# Altium schematic symbol library Capacitor - Aluminium TH.SchLib: 4591 symbols (part 6 of 27)
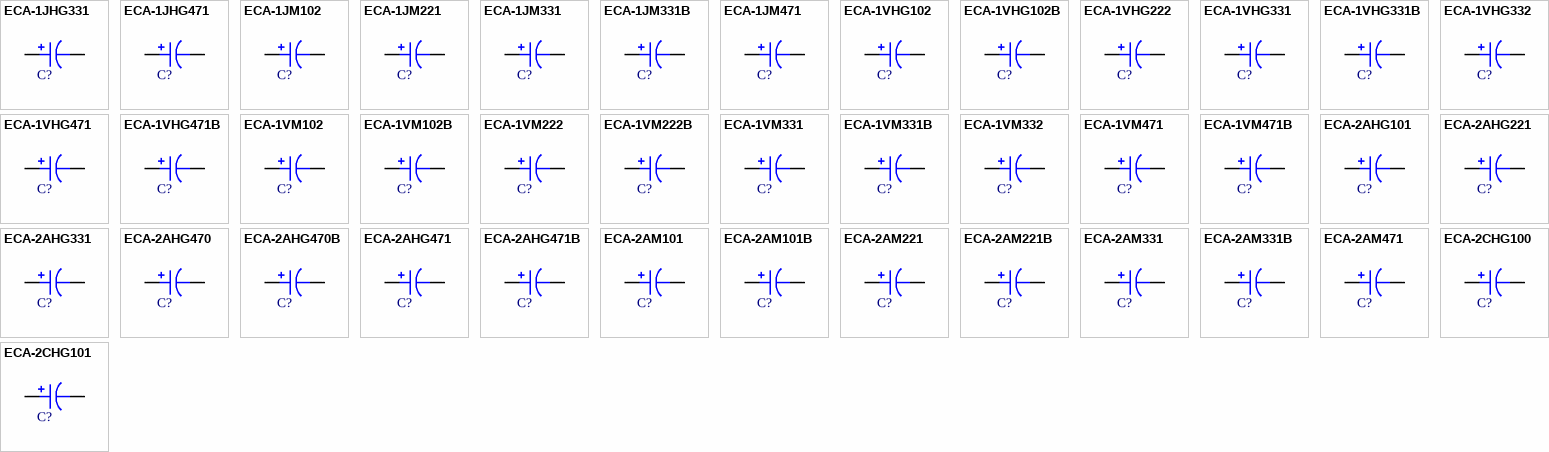
[diagram p119: symbols ECA-1JHG331 to ECA-2CHG101]

## ECA-2CHG100
designator C?, comment 10uF  (value not drawn)
CAP ALUM 10UF 20% 160V RADIAL; Part Number: ECA-2CHG100; Manufacturer: Panasonic Electronic Components; TemperatureRange: -25C ~ 105C; Type: Polar; Ripple Current: 70mA @ 120Hz; Value: 10uF; PartId: 24869; Supplier 1: Digi-Key; Supplier Part Number 1: P5856-ND; ComponentLink1Description: Datasheet; ComponentLink1URL: http://industrial.panasonic.com/www-cgi/jvcr13pz.cgi?E+PZ+3+ABA0026+ECA2CHG100+7+WW; ComponentLink2Description: Digi-Key Listing; ComponentLink2URL: https://www.digikey.com/product-detail/en/panasonic-electronic-components/ECA-2CHG100/P5856-ND/245205; Tolerance: 20%; Voltage: 160V; Price: 0.48; Device Package: Radial, Can, 10mm
footprint CAP AL TH D10 L5 H14.5
pins: 1, 2

## ECA-2CHG101
designator C?, comment 100uF  (value not drawn)
CAP ALUM 100UF 20% 160V RADIAL; Part Number: ECA-2CHG101; Manufacturer: Panasonic Electronic Components; TemperatureRange: -25C ~ 105C; Type: Polar; Ripple Current: 70mA @ 120Hz; Value: 100uF; PartId: 26828; Supplier 1: Digi-Key; Supplier Part Number 1: P5860-ND; ComponentLink1Description: Datasheet; ComponentLink1URL: http://industrial.panasonic.com/www-cgi/jvcr13pz.cgi?E+PZ+3+ABA0026+ECA2CHG101+7+WW; ComponentLink2Description: Digi-Key Listing; ComponentLink2URL: https://www.digikey.com/product-detail/en/panasonic-electronic-components/ECA-2CHG101/P5860-ND/245209; Tolerance: 20%; Voltage: 160V; Price: 0.98; Device Package: Radial, Can, 16mm
footprint CAP AL TH D16 L7.5 H27
pins: 1, 2

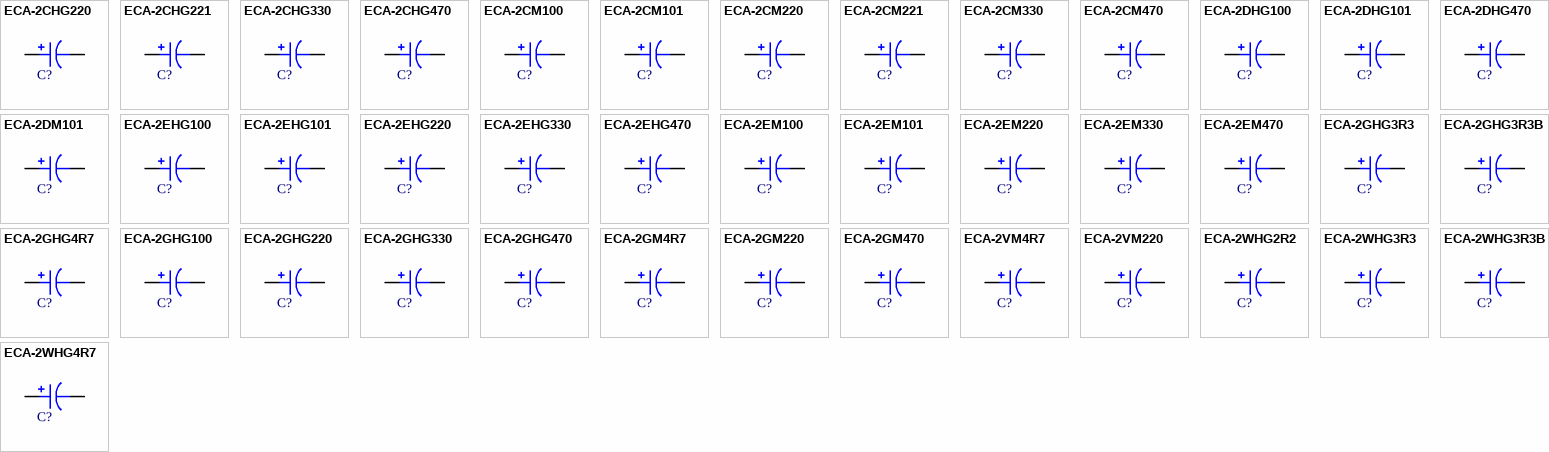
[diagram p22: symbols ECA-2CHG220 to ECA-2WHG4R7]

## ECA-2CHG220
designator C?, comment 22uF  (value not drawn)
CAP ALUM 22UF 20% 160V RADIAL; Part Number: ECA-2CHG220; Manufacturer: Panasonic Electronic Components; TemperatureRange: -25C ~ 105C; Type: Polar; Ripple Current: 130mA @ 120Hz; Value: 22uF; PartId: 25888; Supplier 1: Digi-Key; Supplier Part Number 1: P5857-ND; ComponentLink1Description: Datasheet; ComponentLink1URL: http://industrial.panasonic.com/www-cgi/jvcr13pz.cgi?E+PZ+3+ABA0026+ECA2CHG220+7+WW; ComponentLink2Description: Digi-Key Listing; ComponentLink2URL: https://www.digikey.com/product-detail/en/panasonic-electronic-components/ECA-2CHG220/P5857-ND/245206; Tolerance: 20%; Voltage: 160V; Price: 0.65; Device Package: Radial, Can, 10mm
footprint CAP AL TH D10 L5 H22
pins: 1, 2

## ECA-2CHG221
designator C?, comment 220uF  (value not drawn)
CAP ALUM 220UF 20% 160V RADIAL; Part Number: ECA-2CHG221; Manufacturer: Panasonic Electronic Components; TemperatureRange: -25C ~ 105C; Type: Polar; Ripple Current: 540mA @ 120Hz; Value: 220uF; PartId: 27038; Supplier 1: Digi-Key; Supplier Part Number 1: P5861-ND; ComponentLink1Description: Datasheet; ComponentLink1URL: http://industrial.panasonic.com/www-cgi/jvcr13pz.cgi?E+PZ+3+ABA0026+ECA2CHG221+7+WW; ComponentLink2Description: Digi-Key Listing; ComponentLink2URL: https://www.digikey.com/product-detail/en/panasonic-electronic-components/ECA-2CHG221/P5861-ND/245210; Tolerance: 20%; Voltage: 160V; Price: 1.53; Device Package: Radial, Can, 16mm
footprint CAP AL TH D16 L7.5 H33.5
pins: 1, 2

## ECA-2CHG330
designator C?, comment 33uF  (value not drawn)
CAP ALUM 33UF 20% 160V RADIAL; Part Number: ECA-2CHG330; Manufacturer: Panasonic Electronic Components; TemperatureRange: -25C ~ 105C; Type: Polar; Ripple Current: 180mA @ 120Hz; Value: 33uF; PartId: 25887; Supplier 1: Digi-Key; Supplier Part Number 1: P5858-ND; ComponentLink1Description: Datasheet; ComponentLink1URL: http://industrial.panasonic.com/www-cgi/jvcr13pz.cgi?E+PZ+3+ABA0026+ECA2CHG330+7+WW; ComponentLink2Description: Digi-Key Listing; ComponentLink2URL: https://www.digikey.com/product-detail/en/panasonic-electronic-components/ECA-2CHG330/P5858-ND/245207; Tolerance: 20%; Voltage: 160V; Price: 0.65; Device Package: Radial, Can, 10mm
footprint CAP AL TH D10 L5 H22
pins: 1, 2

## ECA-2CHG470
designator C?, comment 47uF  (value not drawn)
CAP ALUM 47UF 20% 160V RADIAL; Part Number: ECA-2CHG470; Manufacturer: Panasonic Electronic Components; TemperatureRange: -25C ~ 105C; Type: Polar; Ripple Current: 220mA @ 120Hz; Value: 47uF; PartId: 23267; Supplier 1: Digi-Key; Supplier Part Number 1: P5859-ND; ComponentLink1Description: Datasheet; ComponentLink1URL: http://industrial.panasonic.com/www-cgi/jvcr13pz.cgi?E+PZ+3+ABA0026+ECA2CHG470+7+WW; ComponentLink2Description: Digi-Key Listing; ComponentLink2URL: https://www.digikey.com/product-detail/en/panasonic-electronic-components/ECA-2CHG470/P5859-ND/245208; Tolerance: 20%; Voltage: 160V; Price: 0.75; Device Package: Radial, Can, 12.5mm
footprint CAP AL TH D12.5 L5 H22
pins: 1, 2

## ECA-2CM100
designator C?, comment 10uF  (value not drawn)
CAP ALUM 10UF 20% 160V RADIAL; Part Number: ECA-2CM100; Manufacturer: Panasonic Electronic Components; TemperatureRange: -25C ~ 85C; Type: Polar; Ripple Current: 105mA @ 120Hz; Value: 10uF; PartId: 24851; Supplier 1: Digi-Key; Supplier Part Number 1: P5322-ND; ComponentLink1Description: Datasheet; ComponentLink1URL: http://industrial.panasonic.com/www-cgi/jvcr13pz.cgi?E+PZ+3+ABA0012+ECA2CM100+7+WW; ComponentLink2Description: Digi-Key Listing; ComponentLink2URL: https://www.digikey.com/product-detail/en/panasonic-electronic-components/ECA-2CM100/P5322-ND/245076; Tolerance: 20%; Voltage: 160V; Price: 0.47; Device Package: Radial, Can, 10mm
footprint CAP AL TH D10 L5 H14.5
pins: 1, 2

## ECA-2CM101
designator C?, comment 100uF  (value not drawn)
CAP ALUM 100UF 20% 160V RADIAL; Part Number: ECA-2CM101; Manufacturer: Panasonic Electronic Components; TemperatureRange: -25C ~ 85C; Type: Polar; Ripple Current: 515mA @ 120Hz; Value: 100uF; PartId: 23891; Supplier 1: Digi-Key; Supplier Part Number 1: P5326-ND; ComponentLink1Description: Datasheet; ComponentLink1URL: http://industrial.panasonic.com/www-cgi/jvcr13pz.cgi?E+PZ+3+ABA0012+ECA2CM101+7+WW; ComponentLink2Description: Digi-Key Listing; ComponentLink2URL: https://www.digikey.com/product-detail/en/panasonic-electronic-components/ECA-2CM101/P5326-ND/245080; Tolerance: 20%; Voltage: 160V; Price: 0.86; Device Package: Radial, Can, 12.5mm
footprint CAP AL TH D12.5 L5 H27
pins: 1, 2

## ECA-2CM220
designator C?, comment 22uF  (value not drawn)
CAP ALUM 22UF 20% 160V RADIAL; Part Number: ECA-2CM220; Manufacturer: Panasonic Electronic Components; TemperatureRange: -25C ~ 85C; Type: Polar; Ripple Current: 175mA @ 120Hz; Value: 22uF; PartId: 25176; Supplier 1: Digi-Key; Supplier Part Number 1: P5323-ND; ComponentLink1Description: Datasheet; ComponentLink1URL: http://industrial.panasonic.com/www-cgi/jvcr13pz.cgi?E+PZ+3+ABA0012+ECA2CM220+7+WW; ComponentLink2Description: Digi-Key Listing; ComponentLink2URL: https://www.digikey.com/product-detail/en/panasonic-electronic-components/ECA-2CM220/P5323-ND/245077; Tolerance: 20%; Voltage: 160V; Price: 0.46; Device Package: Radial, Can, 10mm
footprint CAP AL TH D10 L5 H17.5
pins: 1, 2

## ECA-2CM221
designator C?, comment 220uF  (value not drawn)
CAP ALUM 220UF 20% 160V RADIAL; Part Number: ECA-2CM221; Manufacturer: Panasonic Electronic Components; TemperatureRange: -25C ~ 85C; Type: Polar; Ripple Current: 830mA @ 120Hz; Value: 220uF; PartId: 27004; Supplier 1: Digi-Key; Supplier Part Number 1: P5327-ND; ComponentLink1Description: Datasheet; ComponentLink1URL: http://industrial.panasonic.com/www-cgi/jvcr13pz.cgi?E+PZ+3+ABA0012+ECA2CM221+7+WW; ComponentLink2Description: Digi-Key Listing; ComponentLink2URL: https://www.digikey.com/product-detail/en/panasonic-electronic-components/ECA-2CM221/P5327-ND/245081; Tolerance: 20%; Voltage: 160V; Price: 1.37; Device Package: Radial, Can, 16mm
footprint CAP AL TH D16 L7.5 H33.5
pins: 1, 2

## ECA-2CM330
designator C?, comment 33uF  (value not drawn)
CAP ALUM 33UF 20% 160V RADIAL; Part Number: ECA-2CM330; Manufacturer: Panasonic Electronic Components; TemperatureRange: -25C ~ 85C; Type: Polar; Ripple Current: 235mA @ 120Hz; Value: 33uF; PartId: 25849; Supplier 1: Digi-Key; Supplier Part Number 1: P5324-ND; ComponentLink1Description: Datasheet; ComponentLink1URL: http://industrial.panasonic.com/www-cgi/jvcr13pz.cgi?E+PZ+3+ABA0012+ECA2CM330+7+WW; ComponentLink2Description: Digi-Key Listing; ComponentLink2URL: https://www.digikey.com/product-detail/en/panasonic-electronic-components/ECA-2CM330/P5324-ND/245078; Tolerance: 20%; Voltage: 160V; Price: 0.54; Device Package: Radial, Can, 10mm
footprint CAP AL TH D10 L5 H22
pins: 1, 2

## ECA-2CM470
designator C?, comment 47uF  (value not drawn)
CAP ALUM 47UF 20% 160V RADIAL; Part Number: ECA-2CM470; Manufacturer: Panasonic Electronic Components; TemperatureRange: -25C ~ 85C; Type: Polar; Ripple Current: 320mA @ 120Hz; Value: 47uF; PartId: 23265; Supplier 1: Digi-Key; Supplier Part Number 1: P5325-ND; ComponentLink1Description: Datasheet; ComponentLink1URL: http://industrial.panasonic.com/www-cgi/jvcr13pz.cgi?E+PZ+3+ABA0012+ECA2CM470+7+WW; ComponentLink2Description: Digi-Key Listing; ComponentLink2URL: https://www.digikey.com/product-detail/en/panasonic-electronic-components/ECA-2CM470/P5325-ND/245079; Tolerance: 20%; Voltage: 160V; Price: 0.75; Device Package: Radial, Can, 12.5mm
footprint CAP AL TH D12.5 L5 H22
pins: 1, 2

## ECA-2DHG100
designator C?, comment 10uF  (value not drawn)
CAP 10UF 200V ELECT NHG RADIAL; Part Number: ECA-2DHG100; Manufacturer: Panasonic Electronic Components; TemperatureRange: -25C ~ 105C; Tolerance: 20%; Type: Polar; Ripple Current: 80mA @ 120Hz; Value: 10uF; PartId: 25300; Supplier 1: Digi-Key; Supplier Part Number 1: P19449-ND; ComponentLink1Description: Datasheet; ComponentLink1URL: http://industrial.panasonic.com/www-cgi/jvcr13pz.cgi?E+PZ+3+ABA0026+ECA2DHG100+7+WW; ComponentLink2Description: Digi-Key Listing; ComponentLink2URL: https://www.digikey.com/product-detail/en/panasonic-electronic-components/ECA-2DHG100/P19449-ND/334745; Voltage: 200V; Price: 0.63; Device Package: Radial, Can, 10mm
footprint CAP AL TH D10 L5 H17.5
pins: 1, 2

## ECA-2DHG101
designator C?, comment 100uF  (value not drawn)
CAP ALUM 100UF 20% 200V RADIAL; Part Number: ECA-2DHG101; Manufacturer: Panasonic Electronic Components; TemperatureRange: -25C ~ 105C; Type: Polar; Ripple Current: 335mA @ 120Hz; Value: 100uF; PartId: 26852; Supplier 1: Digi-Key; Supplier Part Number 1: P19450-ND; ComponentLink1Description: Datasheet; ComponentLink1URL: http://industrial.panasonic.com/www-cgi/jvcr13pz.cgi?E+PZ+3+ABA0026+ECA2DHG101+7+WW; ComponentLink2Description: Digi-Key Listing; ComponentLink2URL: https://www.digikey.com/product-detail/en/panasonic-electronic-components/ECA-2DHG101/P19450-ND/2688822; Tolerance: 20%; Voltage: 200V; Price: 1.09; Device Package: Radial, Can, 16mm
footprint CAP AL TH D16 L7.5 H27
pins: 1, 2

## ECA-2DHG470
designator C?, comment 47uF  (value not drawn)
CAP ALUM 47UF 20% 200V RADIAL; Part Number: ECA-2DHG470; Manufacturer: Panasonic Electronic Components; TemperatureRange: -25C ~ 105C; Type: Polar; Ripple Current: 220mA @ 120Hz; Value: 47uF; PartId: 23291; Supplier 1: Digi-Key; Supplier Part Number 1: P19452-ND; ComponentLink1Description: Datasheet; ComponentLink1URL: http://industrial.panasonic.com/www-cgi/jvcr13pz.cgi?E+PZ+3+ABA0026+ECA2DHG470+7+WW; ComponentLink2Description: Digi-Key Listing; ComponentLink2URL: https://www.digikey.com/product-detail/en/panasonic-electronic-components/ECA-2DHG470/P19452-ND/2688834; Tolerance: 20%; Voltage: 200V; Price: 0.79; Device Package: Radial, Can, 12.5mm
footprint CAP AL TH D12.5 L5 H22
pins: 1, 2

## ECA-2DM101
designator C?, comment 100uF  (value not drawn)
CAP ALUM 100UF 20% 200V RADIAL; Part Number: ECA-2DM101; Manufacturer: Panasonic Electronic Components; TemperatureRange: -25C ~ 85C; Type: Polar; Ripple Current: 475mA @ 120Hz; Value: 100uF; PartId: 26848; Supplier 1: Digi-Key; Supplier Part Number 1: P19453-ND; ComponentLink1Description: Datasheet; ComponentLink1URL: http://industrial.panasonic.com/www-cgi/jvcr13pz.cgi?E+PZ+3+ABA0012+ECA2DM101+7+WW; ComponentLink2Description: Digi-Key Listing; ComponentLink2URL: https://www.digikey.com/product-detail/en/panasonic-electronic-components/ECA-2DM101/P19453-ND/2688844; Tolerance: 20%; Voltage: 200V; Price: 1.04; Device Package: Radial, Can, 16mm
footprint CAP AL TH D16 L7.5 H27
pins: 1, 2

## ECA-2EHG100
designator C?, comment 10uF  (value not drawn)
CAP ALUM 10UF 20% 250V RADIAL; Part Number: ECA-2EHG100; Manufacturer: Panasonic Electronic Components; TemperatureRange: -25C ~ 105C; Type: Polar; Ripple Current: 88mA @ 120Hz; Value: 10uF; PartId: 25257; Supplier 1: Digi-Key; Supplier Part Number 1: P5867-ND; ComponentLink1Description: Datasheet; ComponentLink1URL: http://industrial.panasonic.com/www-cgi/jvcr13pz.cgi?E+PZ+3+ABA0026+ECA2EHG100+7+WW; ComponentLink2Description: Digi-Key Listing; ComponentLink2URL: https://www.digikey.com/product-detail/en/panasonic-electronic-components/ECA-2EHG100/P5867-ND/245216; Tolerance: 20%; Voltage: 250V; Price: 0.59; Device Package: Radial, Can, 10mm
footprint CAP AL TH D10 L5 H17.5
pins: 1, 2

## ECA-2EHG101
designator C?, comment 100uF  (value not drawn)
CAP ALUM 100UF 20% 250V RADIAL; Part Number: ECA-2EHG101; Manufacturer: Panasonic Electronic Components; TemperatureRange: -25C ~ 105C; Type: Polar; Ripple Current: 365mA @ 120Hz; Value: 100uF; PartId: 27013; Supplier 1: Digi-Key; Supplier Part Number 1: P5871-ND; ComponentLink1Description: Datasheet; ComponentLink1URL: http://industrial.panasonic.com/www-cgi/jvcr13pz.cgi?E+PZ+3+ABA0026+ECA2EHG101+7+WW; ComponentLink2Description: Digi-Key Listing; ComponentLink2URL: https://www.digikey.com/product-detail/en/panasonic-electronic-components/ECA-2EHG101/P5871-ND/245220; Tolerance: 20%; Voltage: 250V; Price: 1.42; Device Package: Radial, Can, 16mm
footprint CAP AL TH D16 L7.5 H33.5
pins: 1, 2

## ECA-2EHG220
designator C?, comment 22uF  (value not drawn)
CAP ALUM 22UF 20% 250V RADIAL; Part Number: ECA-2EHG220; Manufacturer: Panasonic Electronic Components; TemperatureRange: -25C ~ 105C; Type: Polar; Ripple Current: 155mA @ 120Hz; Value: 22uF; PartId: 23287; Supplier 1: Digi-Key; Supplier Part Number 1: P5868-ND; ComponentLink1Description: Datasheet; ComponentLink1URL: http://industrial.panasonic.com/www-cgi/jvcr13pz.cgi?E+PZ+3+ABA0026+ECA2EHG220+7+WW; ComponentLink2Description: Digi-Key Listing; ComponentLink2URL: https://www.digikey.com/product-detail/en/panasonic-electronic-components/ECA-2EHG220/P5868-ND/245217; Tolerance: 20%; Voltage: 250V; Price: 0.79; Device Package: Radial, Can, 12.5mm
footprint CAP AL TH D12.5 L5 H22
pins: 1, 2

## ECA-2EHG330
designator C?, comment 33uF  (value not drawn)
CAP ALUM 33UF 20% 250V RADIAL; Part Number: ECA-2EHG330; Manufacturer: Panasonic Electronic Components; TemperatureRange: -25C ~ 105C; Type: Polar; Ripple Current: 190mA @ 120Hz; Value: 33uF; PartId: 23347; Supplier 1: Digi-Key; Supplier Part Number 1: P5869-ND; ComponentLink1Description: Datasheet; ComponentLink1URL: http://industrial.panasonic.com/www-cgi/jvcr13pz.cgi?E+PZ+3+ABA0026+ECA2EHG330+7+WW; ComponentLink2Description: Digi-Key Listing; ComponentLink2URL: https://www.digikey.com/product-detail/en/panasonic-electronic-components/ECA-2EHG330/P5869-ND/245218; Tolerance: 20%; Voltage: 250V; Price: 0.85; Device Package: Radial, Can, 12.5mm
footprint CAP AL TH D12.5 L5 H22
pins: 1, 2

## ECA-2EHG470
designator C?, comment 47uF  (value not drawn)
CAP ALUM 47UF 20% 250V RADIAL; Part Number: ECA-2EHG470; Manufacturer: Panasonic Electronic Components; TemperatureRange: -25C ~ 105C; Type: Polar; Ripple Current: 230mA @ 120Hz; Value: 47uF; PartId: 23953; Supplier 1: Digi-Key; Supplier Part Number 1: P5870-ND; ComponentLink1Description: Datasheet; ComponentLink1URL: http://industrial.panasonic.com/www-cgi/jvcr13pz.cgi?E+PZ+3+ABA0026+ECA2EHG470+7+WW; ComponentLink2Description: Digi-Key Listing; ComponentLink2URL: https://www.digikey.com/product-detail/en/panasonic-electronic-components/ECA-2EHG470/P5870-ND/245219; Tolerance: 20%; Voltage: 250V; Price: 0.98; Device Package: Radial, Can, 12.5mm
footprint CAP AL TH D12.5 L5 H27
pins: 1, 2

## ECA-2EM100
designator C?, comment 10uF  (value not drawn)
CAP ALUM 10UF 20% 250V RADIAL; Part Number: ECA-2EM100; Manufacturer: Panasonic Electronic Components; TemperatureRange: -25C ~ 85C; Type: Polar; Ripple Current: 110mA @ 120Hz; Value: 10uF; PartId: 25177; Supplier 1: Digi-Key; Supplier Part Number 1: P5334-ND; ComponentLink1Description: Datasheet; ComponentLink1URL: http://industrial.panasonic.com/www-cgi/jvcr13pz.cgi?E+PZ+3+ABA0012+ECA2EM100+7+WW; ComponentLink2Description: Digi-Key Listing; ComponentLink2URL: https://www.digikey.com/product-detail/en/panasonic-electronic-components/ECA-2EM100/P5334-ND/245088; Tolerance: 20%; Voltage: 250V; Price: 0.46; Device Package: Radial, Can, 10mm
footprint CAP AL TH D10 L5 H17.5
pins: 1, 2

## ECA-2EM101
designator C?, comment 100uF  (value not drawn)
CAP ALUM 100UF 20% 250V RADIAL; Part Number: ECA-2EM101; Manufacturer: Panasonic Electronic Components; TemperatureRange: -25C ~ 85C; Type: Polar; Ripple Current: 530mA @ 120Hz; Value: 100uF; PartId: 26987; Supplier 1: Digi-Key; Supplier Part Number 1: P5338-ND; ComponentLink1Description: Datasheet; ComponentLink1URL: http://industrial.panasonic.com/www-cgi/jvcr13pz.cgi?E+PZ+3+ABA0012+ECA2EM101+7+WW; ComponentLink2Description: Digi-Key Listing; ComponentLink2URL: https://www.digikey.com/product-detail/en/panasonic-electronic-components/ECA-2EM101/P5338-ND/245092; Tolerance: 20%; Voltage: 250V; Price: 1.26; Device Package: Radial, Can, 16mm
footprint CAP AL TH D16 L7.5 H33.5
pins: 1, 2

## ECA-2EM220
designator C?, comment 22uF  (value not drawn)
CAP ALUM 22UF 20% 250V RADIAL; Part Number: ECA-2EM220; Manufacturer: Panasonic Electronic Components; TemperatureRange: -25C ~ 85C; Type: Polar; Ripple Current: 180mA @ 120Hz; Value: 22uF; PartId: 25862; Supplier 1: Digi-Key; Supplier Part Number 1: P5335-ND; ComponentLink1Description: Datasheet; ComponentLink1URL: http://industrial.panasonic.com/www-cgi/jvcr13pz.cgi?E+PZ+3+ABA0012+ECA2EM220+7+WW; ComponentLink2Description: Digi-Key Listing; ComponentLink2URL: https://www.digikey.com/product-detail/en/panasonic-electronic-components/ECA-2EM220/P5335-ND/245089; Tolerance: 20%; Voltage: 250V; Price: 0.6; Device Package: Radial, Can, 10mm
footprint CAP AL TH D10 L5 H22
pins: 1, 2

## ECA-2EM330
designator C?, comment 33uF  (value not drawn)
CAP ALUM 33UF 20% 250V RADIAL; Part Number: ECA-2EM330; Manufacturer: Panasonic Electronic Components; TemperatureRange: -25C ~ 85C; Type: Polar; Ripple Current: 250mA @ 120Hz; Value: 33uF; PartId: 23266; Supplier 1: Digi-Key; Supplier Part Number 1: P5336-ND; ComponentLink1Description: Datasheet; ComponentLink1URL: http://industrial.panasonic.com/www-cgi/jvcr13pz.cgi?E+PZ+3+ABA0012+ECA2EM330+7+WW; ComponentLink2Description: Digi-Key Listing; ComponentLink2URL: https://www.digikey.com/product-detail/en/panasonic-electronic-components/ECA-2EM330/P5336-ND/245090; Tolerance: 20%; Voltage: 250V; Price: 0.75; Device Package: Radial, Can, 12.5mm
footprint CAP AL TH D12.5 L5 H22
pins: 1, 2

## ECA-2EM470
designator C?, comment 47uF  (value not drawn)
CAP ALUM 47UF 20% 250V RADIAL; Part Number: ECA-2EM470; Manufacturer: Panasonic Electronic Components; TemperatureRange: -25C ~ 85C; Type: Polar; Ripple Current: 330mA @ 120Hz; Value: 47uF; PartId: 23892; Supplier 1: Digi-Key; Supplier Part Number 1: P5337-ND; ComponentLink1Description: Datasheet; ComponentLink1URL: http://industrial.panasonic.com/www-cgi/jvcr13pz.cgi?E+PZ+3+ABA0012+ECA2EM470+7+WW; ComponentLink2Description: Digi-Key Listing; ComponentLink2URL: https://www.digikey.com/product-detail/en/panasonic-electronic-components/ECA-2EM470/P5337-ND/245091; Tolerance: 20%; Voltage: 250V; Price: 0.86; Device Package: Radial, Can, 12.5mm
footprint CAP AL TH D12.5 L5 H27
pins: 1, 2

## ECA-2GHG3R3
designator C?, comment 3.3uF  (value not drawn)
CAP ALUM 3.3UF 20% 400V RADIAL; Part Number: ECA-2GHG3R3; Manufacturer: Panasonic Electronic Components; TemperatureRange: -25C ~ 105C; Type: Polar; Ripple Current: 40mA @ 120Hz; Value: 3.3uF; PartId: 24930; Supplier 1: Digi-Key; Supplier Part Number 1: P19459-ND; ComponentLink1Description: Datasheet; ComponentLink1URL: http://industrial.panasonic.com/www-cgi/jvcr13pz.cgi?E+PZ+3+ABA0026+ECA2GHG3R3+7+WW; ComponentLink2Description: Digi-Key Listing; ComponentLink2URL: https://www.digikey.com/product-detail/en/panasonic-electronic-components/ECA-2GHG3R3/P19459-ND/2688899; Tolerance: 20%; Voltage: 400V; Price: 0.5; Device Package: Radial, Can, 10mm
footprint CAP AL TH D10 L5 H14.5
pins: 1, 2

## ECA-2GHG3R3B
designator C?, comment 3.3uF  (value not drawn)
CAP ALUM 3.3UF 20% 400V RADIAL; Part Number: ECA-2GHG3R3B; Manufacturer: Panasonic Electronic Components; TemperatureRange: -25C ~ 105C; Type: Polar; Ripple Current: 40mA @ 120Hz; Value: 3.3uF; PartId: 24597; Supplier 1: Digi-Key; Supplier Part Number 1: P19570TB-ND; ComponentLink1Description: Datasheet; ComponentLink1URL: http://industrial.panasonic.com/www-cgi/jvcr13pz.cgi?E+PZ+3+ABA0026+ECA2GHG3R3B+7+WW; ComponentLink2Description: Digi-Key Listing; ComponentLink2URL: https://www.digikey.com/product-detail/en/panasonic-electronic-components/ECA-2GHG3R3B/P19570TB-ND/2688900; Tolerance: 20%; Voltage: 400V; Price: 0.1728; Device Package: Radial, Can, 10mm
footprint CAP AL TH D10 L5 H14.5
pins: 1, 2

## ECA-2GHG4R7
designator C?, comment 4.7uF  (value not drawn)
CAP ALUM 4.7UF 20% 400V RADIAL; Part Number: ECA-2GHG4R7; Manufacturer: Panasonic Electronic Components; TemperatureRange: -25C ~ 105C; Type: Polar; Ripple Current: 50mA @ 120Hz; Value: 4.7uF; PartId: 25298; Supplier 1: Digi-Key; Supplier Part Number 1: P19461-ND; ComponentLink1Description: Datasheet; ComponentLink1URL: http://industrial.panasonic.com/www-cgi/jvcr13pz.cgi?E+PZ+3+ABA0026+ECA2GHG4R7+7+WW; ComponentLink2Description: Digi-Key Listing; ComponentLink2URL: https://www.digikey.com/product-detail/en/panasonic-electronic-components/ECA-2GHG4R7/P19461-ND/2688902; Tolerance: 20%; Voltage: 400V; Price: 0.63; Device Package: Radial, Can, 10mm
footprint CAP AL TH D10 L5 H17.5
pins: 1, 2

## ECA-2GHG100
designator C?, comment 10uF  (value not drawn)
CAP ALUM 10UF 20% 400V RADIAL; Part Number: ECA-2GHG100; Manufacturer: Panasonic Electronic Components; TemperatureRange: -25C ~ 105C; Type: Polar; Ripple Current: 80mA @ 120Hz; Value: 10uF; PartId: 25919; Supplier 1: Digi-Key; Supplier Part Number 1: P19455-ND; ComponentLink1Description: Datasheet; ComponentLink1URL: http://industrial.panasonic.com/www-cgi/jvcr13pz.cgi?E+PZ+3+ABA0026+ECA2GHG100+7+WW; ComponentLink2Description: Digi-Key Listing; ComponentLink2URL: https://www.digikey.com/product-detail/en/panasonic-electronic-components/ECA-2GHG100/P19455-ND/2688890; Tolerance: 20%; Voltage: 400V; Price: 0.71; Device Package: Radial, Can, 10mm
footprint CAP AL TH D10 L5 H22
pins: 1, 2

## ECA-2GHG220
designator C?, comment 22uF  (value not drawn)
CAP ALUM 22UF 20% 400V RADIAL; Part Number: ECA-2GHG220; Manufacturer: Panasonic Electronic Components; TemperatureRange: -25C ~ 105C; Type: Polar; Ripple Current: 145mA @ 120Hz; Value: 22uF; PartId: 23958; Supplier 1: Digi-Key; Supplier Part Number 1: P19456-ND; ComponentLink1Description: Datasheet; ComponentLink1URL: http://industrial.panasonic.com/www-cgi/jvcr13pz.cgi?E+PZ+3+ABA0026+ECA2GHG220+7+WW; ComponentLink2Description: Digi-Key Listing; ComponentLink2URL: https://www.digikey.com/product-detail/en/panasonic-electronic-components/ECA-2GHG220/P19456-ND/2688892; Tolerance: 20%; Voltage: 400V; Price: 0.98; Device Package: Radial, Can, 12.5mm
footprint CAP AL TH D12.5 L5 H27
pins: 1, 2

## ECA-2GHG330
designator C?, comment 33uF  (value not drawn)
CAP ALUM 33UF 20% 400V RADIAL; Part Number: ECA-2GHG330; Manufacturer: Panasonic Electronic Components; TemperatureRange: -25C ~ 105C; Type: Polar; Ripple Current: 195mA @ 120Hz; Value: 33uF; PartId: 26887; Supplier 1: Digi-Key; Supplier Part Number 1: P19458-ND; ComponentLink1Description: Datasheet; ComponentLink1URL: http://industrial.panasonic.com/www-cgi/jvcr13pz.cgi?E+PZ+3+ABA0026+ECA2GHG330+7+WW; ComponentLink2Description: Digi-Key Listing; ComponentLink2URL: https://www.digikey.com/product-detail/en/panasonic-electronic-components/ECA-2GHG330/P19458-ND/2688897; Tolerance: 20%; Voltage: 400V; Price: 1.31; Device Package: Radial, Can, 16mm
footprint CAP AL TH D16 L7.5 H27
pins: 1, 2

## ECA-2GHG470
designator C?, comment 47uF  (value not drawn)
CAP ALUM 47UF 20% 400V RADIAL; Part Number: ECA-2GHG470; Manufacturer: Panasonic Electronic Components; TemperatureRange: -25C ~ 105C; Type: Polar; Ripple Current: 250mA @ 120Hz; Value: 47uF; PartId: 27073; Supplier 1: Digi-Key; Supplier Part Number 1: P19460-ND; ComponentLink1Description: Datasheet; ComponentLink1URL: http://industrial.panasonic.com/www-cgi/jvcr13pz.cgi?E+PZ+3+ABA0026+ECA2GHG470+7+WW; ComponentLink2Description: Digi-Key Listing; ComponentLink2URL: https://www.digikey.com/product-detail/en/panasonic-electronic-components/ECA-2GHG470/P19460-ND/2688901; Tolerance: 20%; Voltage: 400V; Price: 1.64; Device Package: Radial, Can, 16mm
footprint CAP AL TH D16 L7.5 H33.5
pins: 1, 2

## ECA-2GM4R7
designator C?, comment 4.7uF  (value not drawn)
CAP ALUM 4.7UF 20% 400V RADIAL; Part Number: ECA-2GM4R7; Manufacturer: Panasonic Electronic Components; TemperatureRange: -25C ~ 85C; Type: Polar; Ripple Current: 72mA @ 120Hz; Value: 4.7uF; PartId: 25202; Supplier 1: Digi-Key; Supplier Part Number 1: P19467-ND; ComponentLink1Description: Datasheet; ComponentLink1URL: http://industrial.panasonic.com/www-cgi/jvcr13pz.cgi?E+PZ+3+ABA0012+ECA2GM4R7+7+WW; ComponentLink2Description: Digi-Key Listing; ComponentLink2URL: https://www.digikey.com/product-detail/en/panasonic-electronic-components/ECA-2GM4R7/P19467-ND/2688920; Tolerance: 20%; Voltage: 400V; Price: 0.5; Device Package: Radial, Can, 10mm
footprint CAP AL TH D10 L5 H17.5
pins: 1, 2

## ECA-2GM220
designator C?, comment 22uF  (value not drawn)
CAP ALUM 22UF 20% 400V RADIAL; Part Number: ECA-2GM220; Manufacturer: Panasonic Electronic Components; TemperatureRange: -25C ~ 85C; Type: Polar; Ripple Current: 215mA @ 120Hz; Value: 22uF; PartId: 23912; Supplier 1: Digi-Key; Supplier Part Number 1: P19464-ND; ComponentLink1Description: Datasheet; ComponentLink1URL: http://industrial.panasonic.com/www-cgi/jvcr13pz.cgi?E+PZ+3+ABA0012+ECA2GM220+7+WW; ComponentLink2Description: Digi-Key Listing; ComponentLink2URL: https://www.digikey.com/product-detail/en/panasonic-electronic-components/ECA-2GM220/P19464-ND/2688910; Tolerance: 20%; Voltage: 400V; Price: 0.92; Device Package: Radial, Can, 12.5mm
footprint CAP AL TH D12.5 L5 H27
pins: 1, 2

## ECA-2GM470
designator C?, comment 47uF  (value not drawn)
CAP ALUM 47UF 20% 400V RADIAL; Part Number: ECA-2GM470; Manufacturer: Panasonic Electronic Components; TemperatureRange: -25C ~ 85C; Type: Polar; Ripple Current: 350mA @ 120Hz; Value: 47uF; PartId: 27039; Supplier 1: Digi-Key; Supplier Part Number 1: P19466-ND; ComponentLink1Description: Datasheet; ComponentLink1URL: http://industrial.panasonic.com/www-cgi/jvcr13pz.cgi?E+PZ+3+ABA0012+ECA2GM470+7+WW; ComponentLink2Description: Digi-Key Listing; ComponentLink2URL: https://www.digikey.com/product-detail/en/panasonic-electronic-components/ECA-2GM470/P19466-ND/2688919; Tolerance: 20%; Voltage: 400V; Price: 1.53; Device Package: Radial, Can, 16mm
footprint CAP AL TH D16 L7.5 H33.5
pins: 1, 2

## ECA-2VM4R7
designator C?, comment 4.7uF  (value not drawn)
CAP ALUM 4.7UF 20% 350V RADIAL; Part Number: ECA-2VM4R7; Manufacturer: Panasonic Electronic Components; TemperatureRange: -25C ~ 85C; Type: Polar; Ripple Current: 65mA @ 120Hz; Value: 4.7uF; PartId: 24765; Supplier 1: Digi-Key; Supplier Part Number 1: P19471-ND; ComponentLink1Description: Datasheet; ComponentLink1URL: http://industrial.panasonic.com/www-cgi/jvcr13pz.cgi?E+PZ+3+ABA0012+ECA2VM4R7+7+WW; ComponentLink2Description: Digi-Key Listing; ComponentLink2URL: https://www.digikey.com/product-detail/en/panasonic-electronic-components/ECA-2VM4R7/P19471-ND/2688958; Tolerance: 20%; Voltage: 350V; Price: 0.43; Device Package: Radial, Can, 10mm
footprint CAP AL TH D10 L5 H14.5
pins: 1, 2

## ECA-2VM220
designator C?, comment 22uF  (value not drawn)
CAP ALUM 22UF 20% 350V RADIAL; Part Number: ECA-2VM220; Manufacturer: Panasonic Electronic Components; TemperatureRange: -25C ~ 85C; Type: Polar; Ripple Current: 195mA @ 120Hz; Value: 22uF; PartId: 23348; Supplier 1: Digi-Key; Supplier Part Number 1: P19470-ND; ComponentLink1Description: Datasheet; ComponentLink1URL: http://industrial.panasonic.com/www-cgi/jvcr13pz.cgi?E+PZ+3+ABA0012+ECA2VM220+7+WW; ComponentLink2Description: Digi-Key Listing; ComponentLink2URL: https://www.digikey.com/product-detail/en/panasonic-electronic-components/ECA-2VM220/P19470-ND/2688947; Tolerance: 20%; Voltage: 350V; Price: 0.85; Device Package: Radial, Can, 12.5mm
footprint CAP AL TH D12.5 L5 H22
pins: 1, 2

## ECA-2WHG2R2
designator C?, comment 2.2uF  (value not drawn)
CAP ALUM 2.2UF 20% 450V RADIAL; Part Number: ECA-2WHG2R2; Manufacturer: Panasonic Electronic Components; TemperatureRange: -25C ~ 105C; Type: Polar; Ripple Current: 29mA @ 120Hz; Value: 2.2uF; PartId: 24819; Supplier 1: Digi-Key; Supplier Part Number 1: P5873-ND; ComponentLink1Description: Datasheet; ComponentLink1URL: http://industrial.panasonic.com/www-cgi/jvcr13pz.cgi?E+PZ+3+ABA0026+ECA2WHG2R2+7+WW; ComponentLink2Description: Digi-Key Listing; ComponentLink2URL: https://www.digikey.com/product-detail/en/panasonic-electronic-components/ECA-2WHG2R2/P5873-ND/245222; Tolerance: 20%; Voltage: 450V; Price: 0.46; Device Package: Radial, Can, 10mm
footprint CAP AL TH D10 L5 H14.5
pins: 1, 2

## ECA-2WHG3R3
designator C?, comment 3.3uF  (value not drawn)